# Altium footprint library pw.PcbLib: 210 footprints (part 13 of 14)
Each footprint in its own frame and in the unit in brackets; x right, y up, seen from the top. Pads: shape width x height; smd on the part's side, far side on the other; paste and mask are expansions set on the pad; w line width, h text height; cw(c..) or ccw(c..) is an arc to the next point about the centre after c.
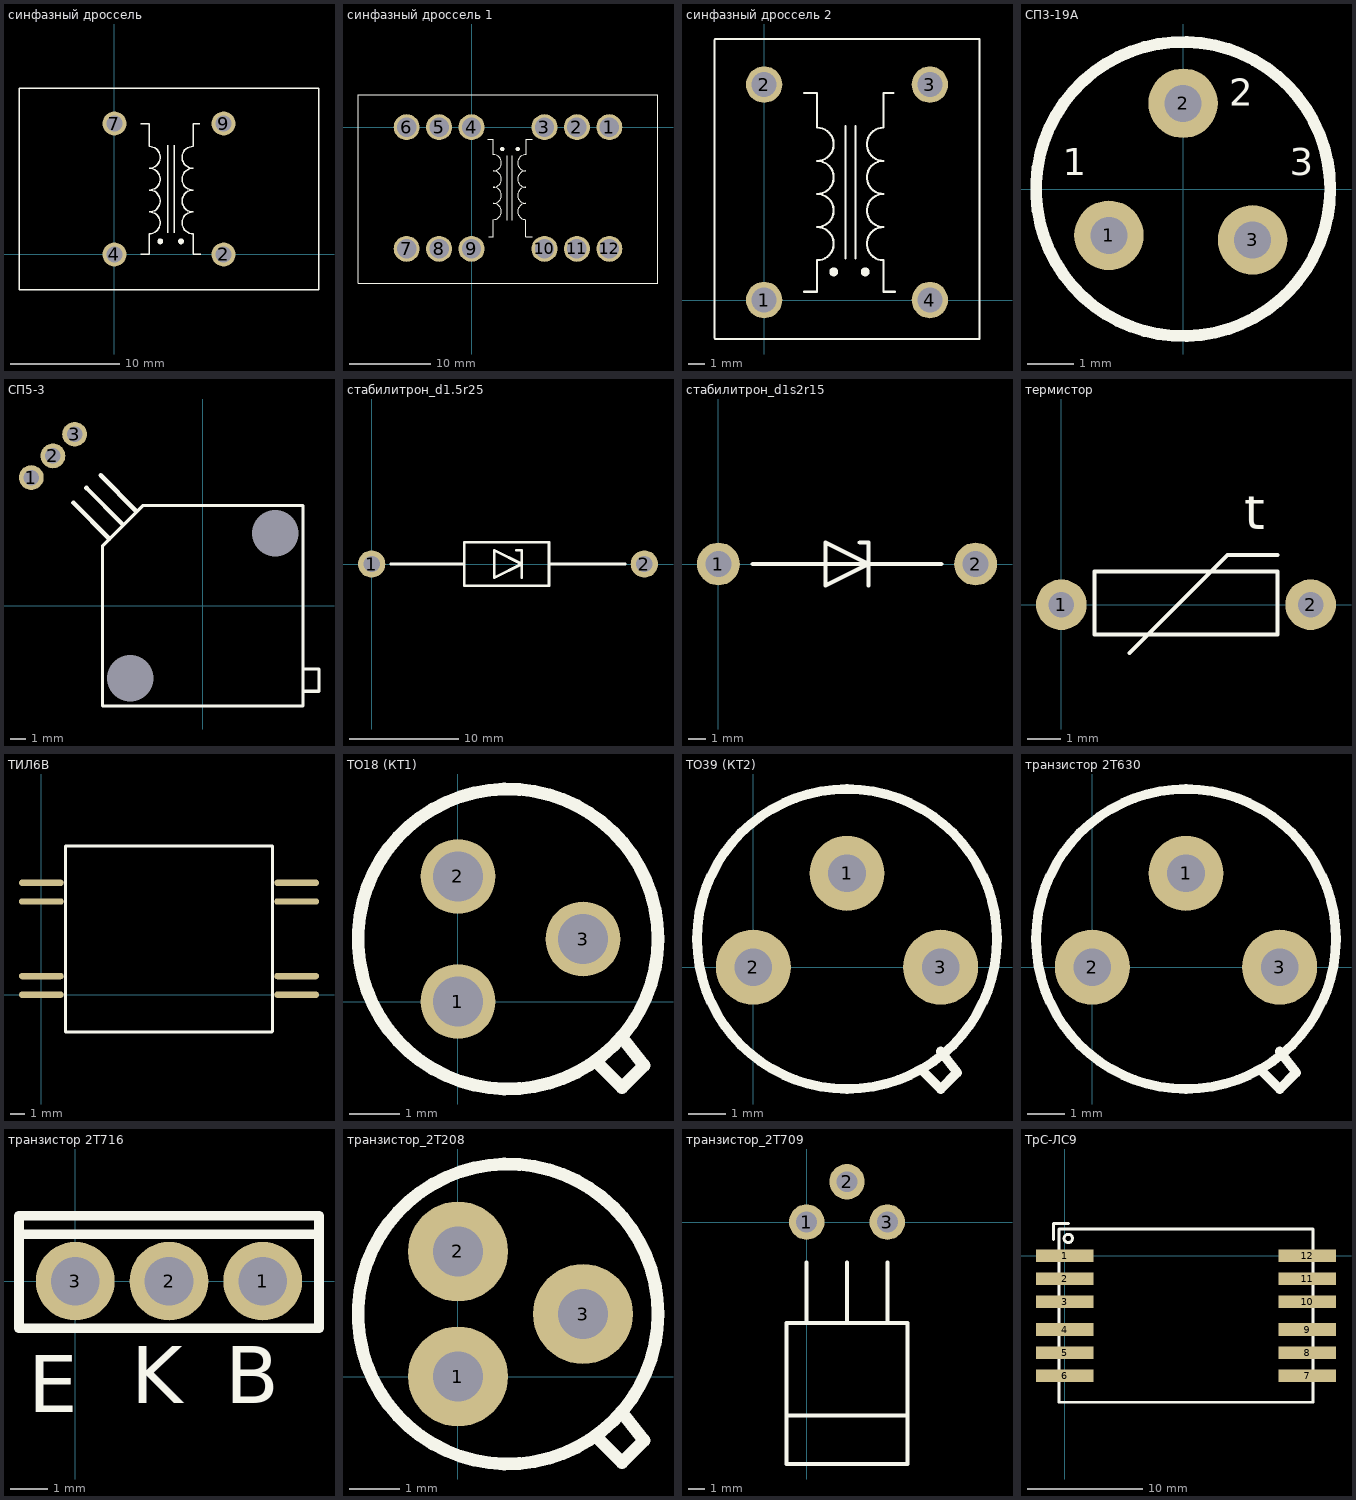
[diagram p12: the footprints below, top view; thin cyan lines are the x and y axes]

## синфазный дроссель [mm]
pads (4):
  round 2.2 hole 1.5: 2(10,0) 4(0,0) 7(0,12) 9(10,12)
Top Overlay:
  circle w0.254: c4.2,1.2 r0.141
  circle w0.254: c6.1,1.2 r0.141
  lines w0.125: 2.4,0 3.2,0 3.2,1.9 ccw(c3.2,2.9) 3.2,3.9 ccw(c3.2,4.9) 3.2,5.9 ccw(c3.2,6.9) 3.2,7.9 ccw(c3.2,8.9) 3.2,9.9 3.2,12 2.4,12 ; 4.9,2 4.9,10 ; 5.5,2 5.5,10 ; 7.8,12 7.2,12 7.2,9.9 ccw(c7.2,8.9) 7.2,7.9 ccw(c7.2,6.9) 7.2,5.9 ccw(c7.2,4.9) 7.2,3.9 ccw(c7.2,2.9) 7.2,1.9 7.2,0 7.9,0 ; -8.75,-3.25 -8.75,15.25 18.75,15.25 18.75,-3.25 -8.75,-3.25

## синфазный дроссель 1 [mm]
pads (12):
  round 3.2 hole 2.4: 1(17,0) 2(13,0) 3(9,0) 4(0,0) 5(-4,0) 6(-8,0) 7(-8,-15) 8(-4,-15) 9(0,-15) 10(9,-15) 11(13,-15) 12(17,-15)
Top Overlay:
  circle w0.254: c5.7,-2.7 r0.141
  circle w0.254: c3.8,-2.7 r0.141
  lines w0.125: 2,-1.5 2.7,-1.5 2.7,-3.4 cw(c2.7,-4.4) 2.7,-5.4 cw(c2.7,-6.4) 2.7,-7.4 cw(c2.7,-8.4) 2.7,-9.4 cw(c2.7,-10.4) 2.7,-11.4 2.7,-13.5 2.1,-13.5 ; 4.4,-11.5 4.4,-3.5 ; 5,-11.5 5,-3.5 ; 7.5,-13.5 6.7,-13.5 6.7,-11.4 cw(c6.7,-10.4) 6.7,-9.4 cw(c6.7,-8.4) 6.7,-7.4 cw(c6.7,-6.4) 6.7,-5.4 cw(c6.7,-4.4) 6.7,-3.4 6.7,-1.5 7.5,-1.5 ; -14,-19.25 -14,4 23,4 23,-19.25 -14,-19.25
3D body "SW3dPS-choke1.STEP": height 24.7, standoff -7.21, extent -8.204,-13.438 17.204,-1.5

## синфазный дроссель 2 [mm] "PLA10 Murata"
pads (4):
  round 2.2 hole 1.5: 1(0,0) 2(0,13) 3(10,13) 4(10,0)
Top Overlay:
  circle w0.254: c4.2,1.7 r0.141
  circle w0.254: c6.1,1.7 r0.141
  lines w0.125: -3,-2.3 -3,15.7 ; -2.95,-2.35 13,-2.35 ; -2.95,15.75 13,15.75 ; 2.4,0.5 3.2,0.5 3.2,2.4 ccw(c3.2,3.4) 3.2,4.4 ccw(c3.2,5.4) 3.2,6.4 ccw(c3.2,7.4) 3.2,8.4 ccw(c3.2,9.4) 3.2,10.4 3.2,12.5 2.4,12.5 ; 4.9,2.5 4.9,10.5 ; 5.5,2.5 5.5,10.5 ; 7.8,12.5 7.2,12.5 7.2,10.4 ccw(c7.2,9.4) 7.2,8.4 ccw(c7.2,7.4) 7.2,6.4 ccw(c7.2,5.4) 7.2,4.4 ccw(c7.2,3.4) 7.2,2.4 7.2,0.5 7.9,0.5 ; 13,-2.3 13,15.7
3D body "User Library-PLA10-1.STEP": height 16.3, standoff -3.3, extent -2.5,-1.685 12.5,15.107

## СП3-19А [mm]
pads (3):
  round 1.5 hole 0.8: 1(-1.6,-1) 2(0,1.85) 3(1.5,-1.1)
Top Overlay:
  circle w0.254: c0,0 r3.175
  text "1" at -2.6,0.1 h1
  text "2" at 1,1.6 h1
  text "3" at 2.3,0.1 h1
3D body "User Library-3329H.step": height 4.57, standoff -1.5, extent -3.185,-3.115 3.165,3.235

## СП5-3 [mm]
pads (5):
  round 1.6 hole 1: 1(-11.1,8.3) 2(-9.7,9.7) 3(-8.3,11.1)
  round 1.6 hole 3: ""(-4.7,-4.7) ""(4.7,4.7)
Top Overlay:
  lines w0.2: 6.5,-5.54 7.53,-5.54 7.53,-4.82 7.53,-4.1 6.5,-4.1 ; -6.5,-6.5 0,-6.5 6.5,-6.5 6.5,0 6.5,6.5 0,6.5 -3.86,6.5 -6.5,3.86 -6.5,0 -6.5,-6.5
  lines w0.3: -8.37,6.67 -6.06,4.34 ; -7.53,7.62 -5.22,5.29 ; -6.61,8.44 -4.3,6.11
3D body "User Library-SP5-3V.step": height 5.9, standoff 0, extent -6.5,-6.5 9.35,6.5

## стабилитрон_d1.5r25 [mm]
pads (2):
  round 2.5 hole 1.5: 1(0,0) 2(25,0)
Top Overlay:
  lines w0.254: 1.75,0 7.5,0 8.5,0 ; 13.25,1.25 13.75,1.25 13.75,-1.25 ; 16.25,0 23.25,0 ; 8.5,-2 8.75,-2 16.25,-2 16.25,2 8.5,2 8.5,-2 ; 11.25,-1.25 11.25,1.25 13.75,0 11.25,-1.25
3D body "User Library-KD-3A.STEP": height 3.3, standoff -2.5, extent -0.435,-1.405 25.435,1.405

## стабилитрон_d1s2r15 [mm]
pads (2):
  round 2.5 hole 1.5: 1(0,0) 2(15,0)
Top Overlay:
  lines w0.254: 2,0 9.75,0 ; 8.25,1.25 8.75,1.25 8.75,-1.25 ; 9.25,0 13,0 ; 6.25,-1.25 6.25,1.25 8.75,0 6.25,-1.25

## термистор [mil]
pads (2):
  round 60 hole 30: 1(0,0) 2(295.28,0)
Top Overlay:
  lines w4.92: 80.71,-57.09 196.85,59.06 255.91,59.06 ; 39.37,-35.43 39.37,39.37 255.91,39.37 255.91,-35.43 39.37,-35.43
  text "t" at 216.54,74.8 h78.74
3D body "User Library-S10K275.STEP": height 511.81, standoff -98.43, extent -86.61,-74.79 385.84,74.87

## ТИЛ6В [mm]
pads (8):
  oval 3x0.43 smd: 1(0,0) 2(0,1.25) 3(0,6.25) 4(0,7.5) 5(17.11,7.5) 6(17.11,6.25) 7(17.11,1.25) 8(17.11,0)
Top Overlay:
  lines w0.2: 1.61,9.97 1.61,-2.5 15.45,-2.5 ; 1.67,9.97 15.49,9.97 15.49,-2.47
3D body: height 3.6, standoff 0, extent 1.61,-2.5 15.49,9.97

## ТО18 (КТ1) [mm] "транзистор_2Т208"
pads (3):
  round 1.5 hole 1: 1(0,0) 2(0,2.5) 3(2.5,1.25)
Top Overlay:
  circle w0.254: c1,1.25 r3
  lines w0.254: 2.781,-1.219 3.281,-1.719 3.719,-1.281 3.281,-0.719
3D body "User Library-TO-18 (KT-1).STEP": height 6.2, standoff -2.5, extent -1.8,-1.787 4.032,4.05

## ТО39 (КТ2) [mm] "транзистор 2Т630,2Т881"
pads (3):
  round 2 hole 1: 1(2.5,2.5) 2(0,0) 3(5,0)
Top Overlay:
  circle w0.254: c2.5,0.75 r4
  lines w0.254: 4.5,-2.75 5,-3.25 5.437,-2.813 5,-2.25
3D body "User Library-TO-39_KT-2-7.STEP": height 9.05, standoff -0.6, extent -2.099,-4.35 7.1,4.85

## транзистор 2Т630 [mm] "2Т881"
pads (3):
  round 2 hole 1: 1(2.5,2.5) 2(0,0) 3(5,0)
Top Overlay:
  circle w0.254: c2.5,0.75 r4
  lines w0.254: 4.5,-2.75 5,-3.25 5.437,-2.813 5,-2.25

## транзистор 2Т716 [mm]
pads (3):
  round 2.1 hole 1.3: 1(5,0) 2(2.5,0) 3(0,0)
Top Overlay:
  lines w0.254: -1.5,1.25 -1.5,-0.375 -1.5,-1.25 6.5,-1.25 6.5,1.25 ; -1.5,1.25 6.5,1.25 ; -1.5,1.25 -1.5,1.75 6.5,1.75 6.5,1.25
  text "E" at -1.25,-3.5 h1.52
  text "K" at 1.5,-3.25 h1.52
  text "B" at 4,-3.25 h1.52

## транзистор_2Т208 [mm]
pads (3):
  round 2 hole 1: 1(0,0) 2(0,2.5) 3(2.5,1.25)
Top Overlay:
  circle w0.254: c1,1.25 r3
  lines w0.254: 2.781,-1.219 3.281,-1.719 3.719,-1.281 3.281,-0.719

## транзистор_2Т709 [mm]
pads (3):
  round 2.2 hole 1.3: 1(0,0) 2(2.5,2.5) 3(5,0)
Top Overlay:
  lines w0.254: -1.25,-12 6.25,-12 ; 0,-6.25 0,-2.5 ; 2.5,-6.25 2.5,-2.5 ; 5,-6.25 5,-2.5 ; -1.25,-15 6.25,-15 6.25,-6.25 -1.25,-6.25 -1.25,-15

## ТрС-ЛС9 [mm] "ЕСКФ.671152.003"
pads (12):
  rect 5x1.1 smd: 1(0,0) 2(0,-2) 3(0,-4) 4(0,-6.4) 5(0,-8.4) 6(0,-10.4) 7(21,-10.4) 8(21,-8.4) 9(21,-6.4) 10(21,-4) 11(21,-2) 12(21,0)
Top Overlay:
  circle w0.254: c0.3,1.5 r0.361
  lines w0.254: -1,1.4 -1,2.8 0.3,2.8 ; -0.5,-12.7 21.5,-12.7 21.5,2.3 -0.5,2.3 -0.5,-12.7
3D body "ТрС-ЛС9.stp": height 6.6, standoff 0, extent -0.5,-12.7 21.5,2.3